# Altium footprint library KNR_Kurs.PcbLib: 250 footprints (part 15 of 16)
Each footprint in its own frame and in the unit in brackets; x right, y up, seen from the top. Pads: shape width x height; smd on the part's side, far side on the other; paste and mask are expansions set on the pad; w line width, h text height; cw(c..) or ccw(c..) is an arc to the next point about the centre after c.
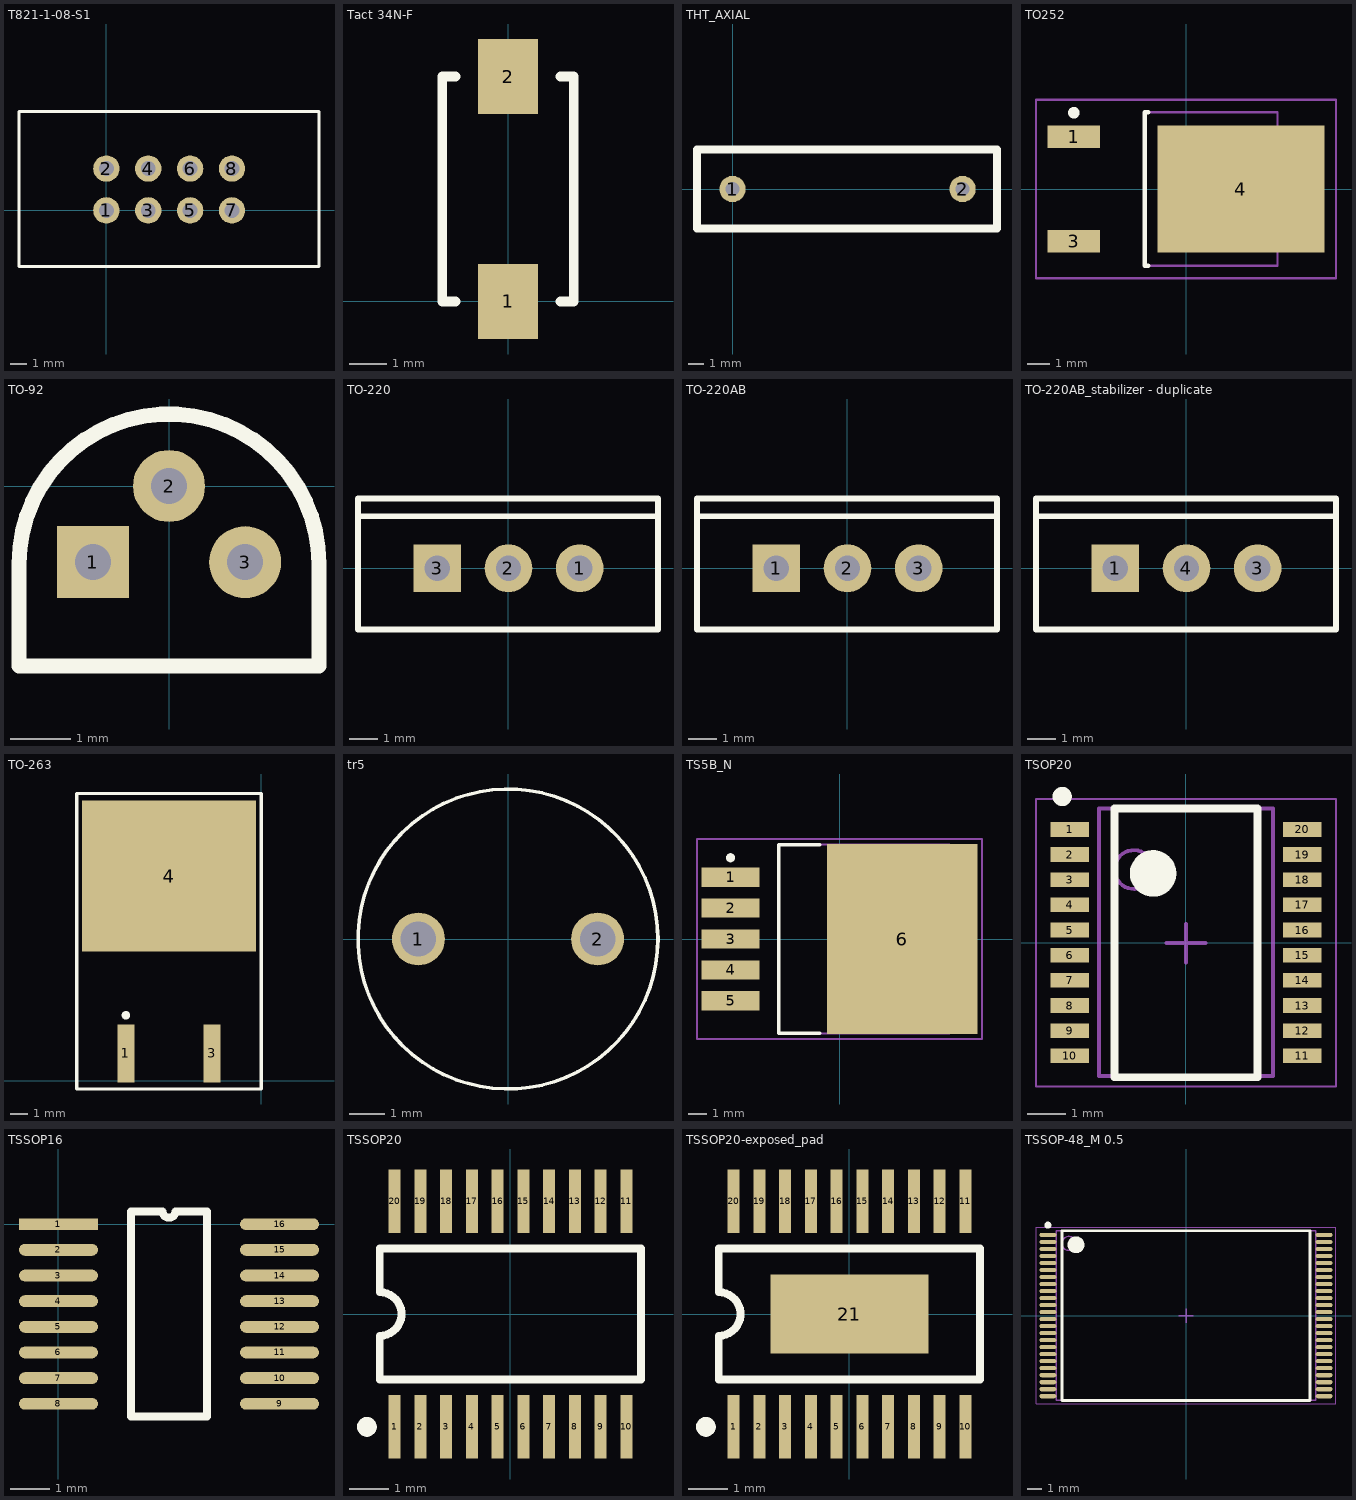
[diagram p14: the footprints below, top view; thin cyan lines are the x and y axes]

## T821-1-08-S1 [mm] "T821-1-08-S1 8 Pin, Men"
pads (8):
  round 1.6 hole 0.9: 1(0,0) 2(0,2.54) 3(2.54,0) 4(2.54,2.54) 5(5.08,0) 6(5.08,2.54) 7(7.62,0) 8(7.62,2.54)
Top Overlay:
  lines w0.2: -5.3,-3.4 12.9,-3.4 12.9,6 -5.3,6 -5.3,-3.4
3D body "T821-1-08-S1.stp": height 9.5, standoff -1.5, extent -5.105,-3.2 12.675,5.8

## Tact 34N-F [mm]
pads (2):
  rect 1.6x2 smd: 1(0,0) 2(0,6)
Top Overlay:
  lines w0.254: -1.4,0 -1.75,0 -1.75,6 -1.4,6 ; 1.4,0 1.75,0 1.75,6 1.4,6
3D body "TACT 34N-F.stp": height 4.2, standoff 0, extent -1.75,-0.7 1.75,6.7

## THT_AXIAL [mm] "General THT AXIAL element"
pads (2):
  round 1.7 hole 0.9: 1(0,0) 2(14.8,0)
Top Overlay:
  lines w0.508: -2.286,-2.54 17.018,-2.54 17.018,2.54 7.366,2.54 -2.286,2.54 -2.286,-2.54
3D body "THT_AXIAL.stp": height 3.2, standoff -2.4, extent -0.232,-1.27 14.964,1.123

## TO252 [mm] "D-PAK, 3-Pads, Body 5,8x6,7mm (max), IPC Low Density"
height 2.38
pads (3):
  rect 2.3x1 smd: 1(-4.9,2.28) 3(-4.9,-2.28)
  rect 7.3x5.55 smd: 4(2.4,0)
Top Overlay:
  circle w0.25: c-4.9,3.33 r0.125
  lines w0.2: -1.65,-3.35 -1.8,-3.35 -1.8,3.35 -1.65,3.35
Mechanical 13:
  lines w0.1: -1.8,-3.35 -1.8,3.35 4,3.35 4,-3.35 -1.8,-3.35
Mechanical 15:
  lines w0.1: -0.5,0 0.5,0 ; 0,-0.5 0,0.5 ; -6.55,-3.9 -6.55,3.9 6.55,3.9 6.55,-3.9 -6.55,-3.9
3D body "TO252_D-Pak.stp": height 2.2, standoff 0, extent -4.74,-3.25 5.2,3.25

## TO-92 [mm]
pads (3):
  rect 1.2x1.2 hole 0.6: 1(-1.27,-1.27)
  round 1.2 hole 0.6: 2(0,0) 3(1.27,-1.27)
Top Overlay:
  lines w0.254: -2.5,-3 -2.5,-1.3 cw(c0,-1.3) 2.5,-1.3 2.5,-3 -2.5,-3
3D body "TO-92.stp": height 6.5, standoff -1.49, extent -2.3,-2.794 2.3,0.706

## TO-220 [mm]
height 19.3
pads (3):
  round 1.7 hole 0.9: 1(2.54,0) 2(0,0)
  rect 1.7x1.7 hole 0.9: 3(-2.54,0)
Top Overlay:
  lines w0.2: -5.366,1.854 5.334,1.854 ; -5.366,-2.184 5.334,-2.184 5.334,2.489 -5.366,2.489 -5.366,-2.184
3D body: height 5, standoff 0, extent -0.4,-0.25 0.4,0.25
3D body: height 5, standoff 0, extent 2.1,-0.25 2.9,0.25
3D body: height 5, standoff 0, extent -2.9,-0.25 -2.1,0.25
3D body "TO220.stp": height 19.5, standoff -3, extent -5,-2.089 5,2.311

## TO-220AB [mm] "TO, Thru-Hole, Vertical, Heatsink Mounted; 3 In-Line Leads; Pitch 2.54 mm"
height 19.3
pads (3):
  rect 1.7x1.7 hole 0.9: 1(-2.54,0)
  round 1.7 hole 0.9: 2(0,0) 3(2.54,0)
Top Overlay:
  lines w0.2: -5.366,1.854 5.334,1.854 ; -5.366,-2.184 -5.366,2.489 5.334,2.489 5.334,-2.184 -5.366,-2.184
3D body: height 5, standoff 0, extent -2.9,-0.25 -2.1,0.25
3D body: height 5, standoff 0, extent 2.1,-0.25 2.9,0.25
3D body: height 5, standoff 0, extent -0.4,-0.25 0.4,0.25
3D body "TO220.stp": height 19.5, standoff -3, extent -5,-2.089 5,2.311

## TO-220AB_stabilizer - duplicate [mm] "TO, Thru-Hole, Vertical, Heatsink Mounted; PIN2->PIN4"
height 19.3
pads (3):
  rect 1.7x1.7 hole 0.9: 1(-2.54,0)
  round 1.7 hole 0.9: 3(2.54,0) 4(0,0)
Top Overlay:
  lines w0.2: -5.366,1.854 5.334,1.854 ; -5.366,-2.184 5.334,-2.184 5.334,2.489 -5.366,2.489 -5.366,-2.184
3D body: height 5, standoff 0, extent -0.4,-0.25 0.4,0.25
3D body: height 5, standoff 0, extent 2.1,-0.25 2.9,0.25
3D body: height 5, standoff 0, extent -2.9,-0.25 -2.1,0.25
3D body "TO220.stp": height 19.5, standoff -3, extent -5,-2.089 5,2.311

## TO-263 [mm] "D2-PAK/TO-263-AB; 3 Leads (1 Cropped); Body 15.9 (inc. leads) x 10.4 mm (LxW max)"
height 4.6
pads (3):
  rect 1x3.4 smd: 1(-7.965,1.6) 3(-2.885,1.6)
  rect 10.25x8.9 smd: 4(-5.425,12.05)
Top Overlay:
  circle w0.25: c-7.965,3.85 r0.125
  lines w0.2: -0.055,-0.491 -10.85,-0.491 -10.85,0 -10.85,16.4 -10.85,16.908 -0.055,16.908 ; 0,-0.491 0,0 0,16.4 0,16.908
3D body "TO263.stp": height 4.5, standoff 0, extent -10.4,0.35 -0.4,15.65

## tr5 [mm] "littlefuse_tr5"
pads (2):
  round 1.5 hole 1: 1(-2.54,0) 2(2.54,0)
Top Overlay:
  circle w0.1: c0,0 r4.25
3D body: height 4, standoff 0, extent 2.052,-0.5 3.048,0.498
3D body: height 4, standoff 0, extent -3.05,-0.5 -2.054,0.498
3D body: height 9, standoff 4, extent -4.25,-4.25 4.216,4.233

## TS5B_N [mm] "D2-PAK, 6-Leads, Body 8.6x10.2mm, Pitch 1.7mm, Lead Span 14.1mm, IPC Medium Density"
height 4.65
pads (6):
  rect 3.2x1.05 smd: 1(-6,3.4) 2(-6,1.7) 3(-6,0) 4(-6,-1.7) 5(-6,-3.4)
  rect 8.3x10.45 smd: 6(3.45,0)
Top Overlay:
  circle w0.25: c-6,4.475 r0.125
  lines w0.2: -1.1,-5.2 -3.35,-5.2 -3.35,5.2 -1.1,5.2
Mechanical 13:
  lines w0.1: -3.35,-5.2 -3.35,5.2 6.05,5.2 6.05,-5.2 -3.35,-5.2
Mechanical 15:
  lines w0.1: -0.5,0 0.5,0 ; 0,-0.5 0,0.5 ; -7.85,-5.5 -7.85,5.5 7.85,5.5 7.85,-5.5 -7.85,-5.5
3D body "TO263.stp": height 4.5, standoff 0, extent -7.075,-5 7.275,5

## TSOP20 [mm] "TSOP, 12 Leads, Body XxXmm, Pitch 0,65mm, Thermal Pad 0,00x0,00mm, IPC Medium Density"
height 1.2
pads (20):
  rect 1x0.38 smd mask+0.07: 1(-3,2.925) 2(-3,2.275) 3(-3,1.625) 4(-3,0.975) 5(-3,0.325) 6(-3,-0.325) 7(-3,-0.975) 8(-3,-1.625) 9(-3,-2.275) 10(-3,-2.925) 11(3,-2.925) 12(3,-2.275) 13(3,-1.625) 14(3,-0.975) 15(3,-0.325) 16(3,0.325) 17(3,0.975) 18(3,1.625) 19(3,2.275) 20(3,2.925)
Top Overlay:
  circle w0.25: c-3.2,3.775 r0.125
  circle w0.6: c-0.85,1.788 r0.3
  lines w0.2: -1.85,-3.475 -1.85,3.463 1.85,3.463 1.85,-3.475 -1.85,-3.475
Mechanical 13:
  circle w0.1: c-1.35,1.888 r0.5
  lines w0.1: -2.25,-3.45 2.25,-3.45 ; -2.25,-3.437 -2.25,3.463 2.25,3.463 2.25,-3.437
Mechanical 15:
  lines w0.05: -3.875,-3.712 3.875,-3.712 3.875,3.713 -3.875,3.713 -3.875,-3.712
  lines w0.1: -0.5,-0.012 0.5,-0.012 ; 0,-0.512 0,0.488
3D body "User Library-tssop-20-1.step": height 1.2, standoff 0, extent -3.3,-3.3 3.3,3.3

## TSSOP16 [mm]
pads (16):
  rect 2x0.3 smd: 1(0,0)
  oval 2x0.3 smd: 2(0,-0.65) 3(0,-1.3) 4(0,-1.95) 5(0,-2.6) 6(0,-3.25) 7(0,-3.9) 8(0,-4.55) 9(5.6,-4.55) 10(5.6,-3.9) 11(5.6,-3.25) 12(5.6,-2.6) 13(5.6,-1.95) 14(5.6,-1.3) 15(5.6,-0.65) 16(5.6,0)
Top Overlay:
  lines w0.2: 1.835,-4.875 3.765,-4.875 3.765,0.325 2.962,0.325 cw(c2.8,0.325) 2.638,0.325 1.835,0.325 1.835,-4.875
3D body "TSSOP16.stp": height 1.2, standoff 0, extent -0.4,-4.8 6,0.2

## TSSOP20 [mm] "20-LEAD PLASTIC TSSOP"
pads (20):
  rect 0.3x1.6 smd: 1(-2.925,-2.85) 2(-2.275,-2.85) 3(-1.625,-2.85) 4(-0.975,-2.85) 5(-0.325,-2.85) 6(0.325,-2.85) 7(0.975,-2.85) 8(1.625,-2.85) 9(2.275,-2.85) 10(2.925,-2.85) 11(2.925,2.85) 12(2.275,2.85) 13(1.625,2.85) 14(0.975,2.85) 15(0.325,2.85) 16(-0.325,2.85) 17(-0.975,2.85) 18(-1.625,2.85) 19(-2.275,2.85) 20(-2.925,2.85)
Top Overlay:
  circle w0.25: c-3.625,-2.85 r0.125
  lines w0.2: -3.3,-1.65 3.3,-1.65 3.3,1.65 -3.3,1.65 -3.3,0.55 cw(c-3.3,0) -3.3,-0.55 -3.3,-1.65
3D body "TSSOP-20.stp": height 1, standoff 0, extent -3.25,-3.2 3.25,3.2

## TSSOP20-exposed_pad [mm] "20-LEAD PLASTIC TSSOP with exposed GND 21 pad"
pads (21):
  rect 0.3x1.6 smd: 1(-2.925,-2.85) 2(-2.275,-2.85) 3(-1.625,-2.85) 4(-0.975,-2.85) 5(-0.325,-2.85) 6(0.325,-2.85) 7(0.975,-2.85) 8(1.625,-2.85) 9(2.275,-2.85) 10(2.925,-2.85) 11(2.925,2.85) 12(2.275,2.85) 13(1.625,2.85) 14(0.975,2.85) 15(0.325,2.85) 16(-0.325,2.85) 17(-0.975,2.85) 18(-1.625,2.85) 19(-2.275,2.85) 20(-2.925,2.85)
  rect 4x2 smd: 21(0,0)
Top Overlay:
  circle w0.25: c-3.625,-2.85 r0.125
  lines w0.2: -3.3,-1.65 -3.3,-0.55 ccw(c-3.3,0) -3.3,0.55 -3.3,1.65 3.3,1.65 3.3,-1.65 -3.3,-1.65
3D body "TSSOP-20.stp": height 1, standoff 0, extent -3.25,-3.2 3.25,3.2

## TSSOP-48_M 0.5 [mm] "TSSOP, 48-Leads, Body 12,00x18,40mm, Pitch 0,50mm, Thermal Pad 0,00x0,00mm, IPC Medium Density"
height 1.2
pads (48):
  oval 1.2x0.3 smd: 1(-9.85,5.75) 2(-9.85,5.25) 3(-9.85,4.75) 4(-9.85,4.25) 5(-9.85,3.75) 6(-9.85,3.25) 7(-9.85,2.75) 8(-9.85,2.25) 9(-9.85,1.75) 10(-9.85,1.25) 11(-9.85,0.75) 12(-9.85,0.25) 13(-9.85,-0.25) 14(-9.85,-0.75) 15(-9.85,-1.25) 16(-9.85,-1.75) 17(-9.85,-2.25) 18(-9.85,-2.75) 19(-9.85,-3.25) 20(-9.85,-3.75) 21(-9.85,-4.25) 22(-9.85,-4.75) 23(-9.85,-5.25) 24(-9.85,-5.75) 25(9.85,-5.75) 26(9.85,-5.25) 27(9.85,-4.75) 28(9.85,-4.25) 29(9.85,-3.75) 30(9.85,-3.25) 31(9.85,-2.75) 32(9.85,-2.25) 33(9.85,-1.75) 34(9.85,-1.25) 35(9.85,-0.75) 36(9.85,-0.25) 37(9.85,0.25) 38(9.85,0.75) 39(9.85,1.25) 40(9.85,1.75) 41(9.85,2.25) 42(9.85,2.75) 43(9.85,3.25) 44(9.85,3.75) 45(9.85,4.25) 46(9.85,4.75) 47(9.85,5.25) 48(9.85,5.75)
Top Overlay:
  circle w0.25: c-9.85,6.45 r0.125
  circle w0.6: c-7.85,5.05 r0.3
  lines w0.2: -8.85,-6.05 -8.85,6.05 8.85,6.05 8.85,-6.05 -8.85,-6.05
Mechanical 13:
  circle w0.1: c-8.35,5.15 r0.5
  lines w0.1: -9.25,-6.05 -9.25,6.05 9.25,6.05 9.25,-6.05 -9.25,-6.05
Mechanical 15:
  lines w0.05: -10.7,-6.3 -10.7,6.3 10.7,6.3 10.7,-6.3 -10.7,-6.3
  lines w0.1: -0.5,0 0.5,0 ; 0,-0.5 0,0.5
3D body "User Library-TSOP48-1.STEP": height 1.2, standoff 0, extent -10.1,-6.05 10.1,6.05